# Altium footprint library microbuilder.PCBLIB: 422 footprints (part 22 of 27)
Each footprint in its own frame and in the unit in brackets; x right, y up, seen from the top. Pads: shape width x height; smd on the part's side, far side on the other; paste and mask are expansions set on the pad; w line width, h text height; cw(c..) or ccw(c..) is an arc to the next point about the centre after c.
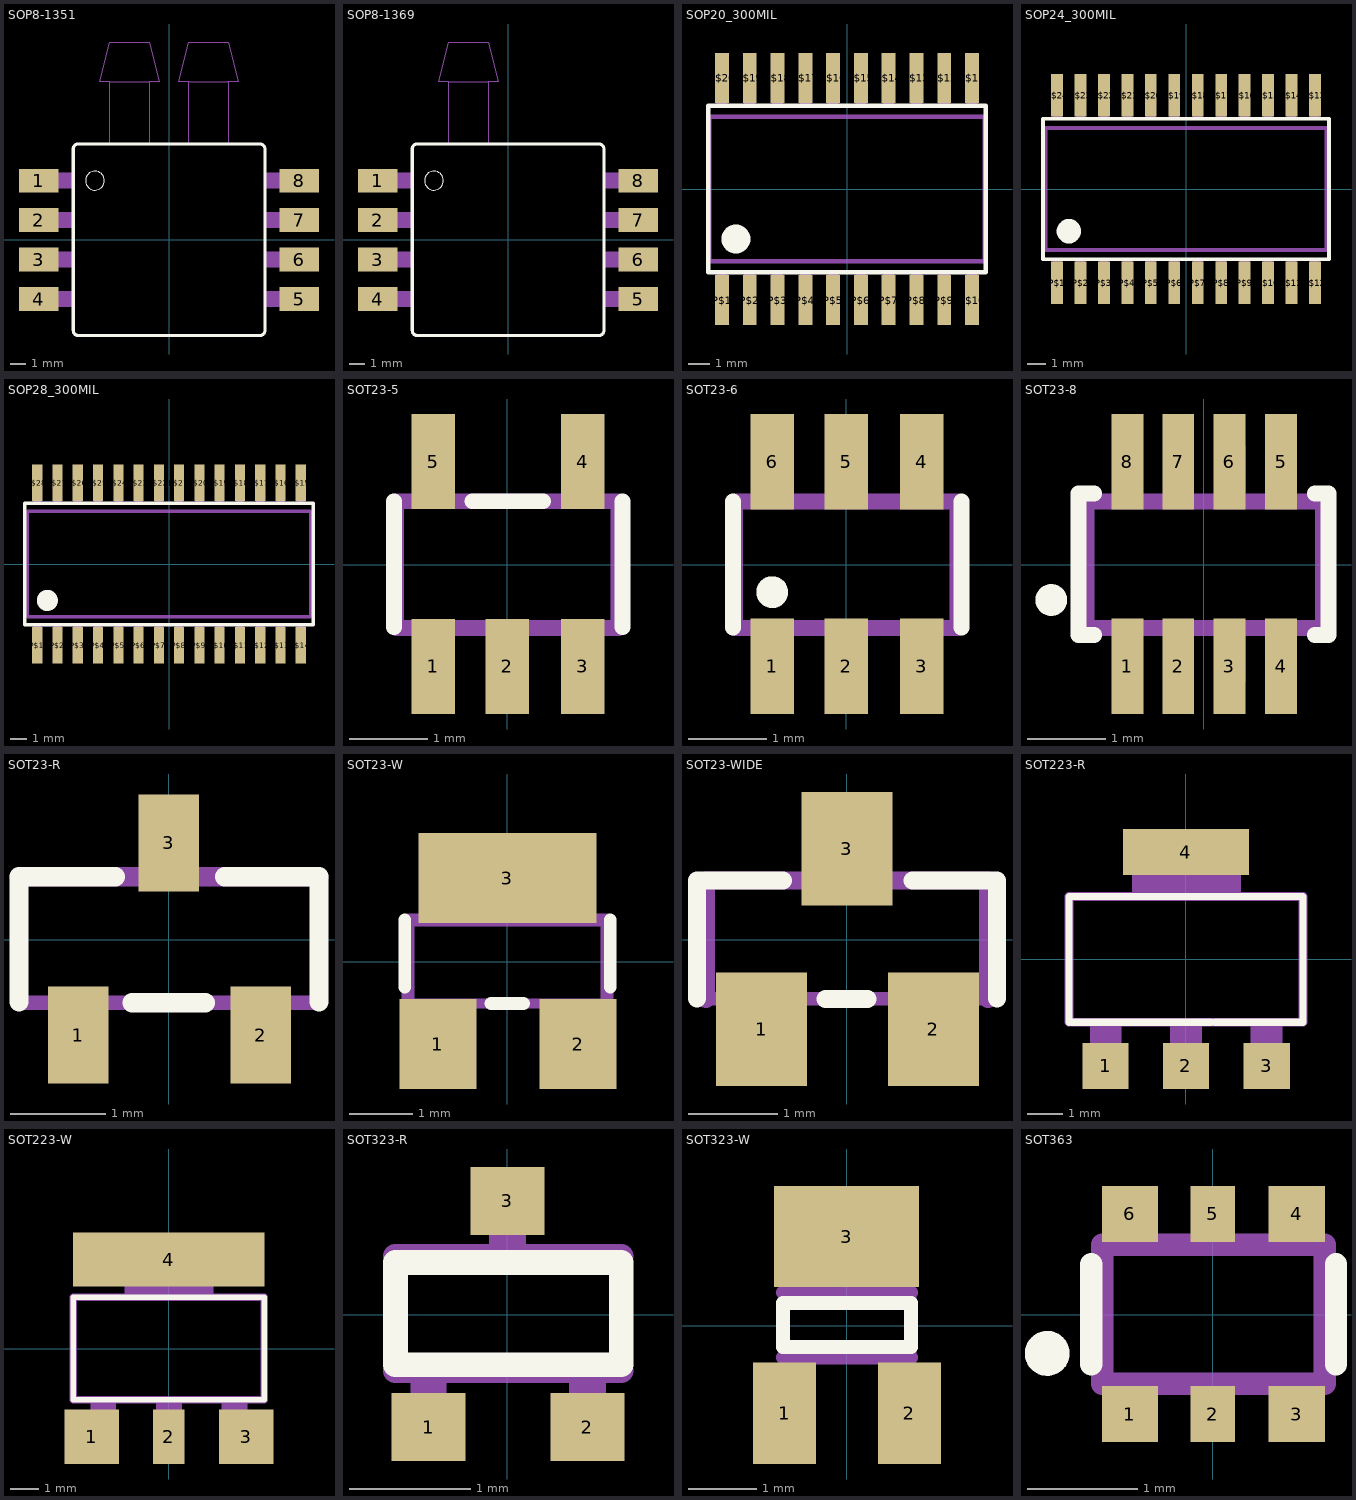
[diagram p21: the footprints below, top view; thin cyan lines are the x and y axes]

## SOP8-1351 [mil]
pads (8):
  rect 100x60 smd: 1(-330,150) 2(-330,50) 3(-330,-50) 4(-330,-150) 5(330,-150) 6(330,-50) 7(330,50) 8(330,150)
Top Overlay:
  circle w0: c-187.5,150 r24
  lines w8: -242.5,-230 ccw(c-230,-230) -230,-242.5 230,-242.5 ccw(c230.25,-229.75) 243,-230 243,230 ccw(c230,230) 230,243 -230,243 ccw(c-229.75,230.25) -242.5,230 -242.5,-230
Mechanical 16:
  rectangle: -350,130 -245,170
  region: 350,170 245,170 245,130 350,130
  rectangle: -350,30 -245,70
  rectangle: -350,-70 -245,-30
  rectangle: -350,-170 -245,-130
  region: 350,70 245,70 245,30 350,30
  region: 350,-30 245,-30 245,-70 350,-70
  region: 350,-130 245,-130 245,-170 350,-170
  lines w2: -150,245 -150,400 ; -50,245 -50,400 ; 50,245 50,400 ; 150,245 150,400 ; -150,400 -175,400 -150,500 -50,500 -25,400 -50,400 ; -150,400 -50,400 ; 50,400 25,400 50,500 150,500 175,400 150,400 ; 50,400 150,400

## SOP8-1369 [mil]
pads (8):
  rect 100x60 smd: 1(-330,150) 2(-330,50) 3(-330,-50) 4(-330,-150) 5(330,-150) 6(330,-50) 7(330,50) 8(330,150)
Top Overlay:
  circle w0: c-187.5,150 r24
  lines w8: -242.5,-230 ccw(c-230,-230) -230,-242.5 230,-242.5 ccw(c230.25,-229.75) 243,-230 243,230 ccw(c230,230) 230,243 -230,243 ccw(c-229.75,230.25) -242.5,230 -242.5,-230
Mechanical 16:
  rectangle: -350,130 -245,170
  region: 350,170 245,170 245,130 350,130
  rectangle: -350,30 -245,70
  rectangle: -350,-70 -245,-30
  rectangle: -350,-170 -245,-130
  region: 350,70 245,70 245,30 350,30
  region: 350,-30 245,-30 245,-70 350,-70
  region: 350,-130 245,-130 245,-170 350,-170
  lines w2: -150,245 -150,400 ; -50,245 -50,400 ; -150,400 -175,400 -150,500 -50,500 -25,400 -50,400 ; -150,400 -50,400

## SOP20_300MIL [mil]
pads (20):
  rect 25x90 smd: P$1(-225,-200) P$2(-175,-200) P$3(-125,-200) P$4(-75,-200) P$5(-25,-200) P$6(25,-200) P$7(75,-200) P$8(125,-200) P$9(175,-200) P$10(225,-200) P$11(225,200) P$12(175,200) P$13(125,200) P$14(75,200) P$15(25,200) P$16(-25,200) P$17(-75,200) P$18(-125,200) P$19(-175,200) P$20(-225,200)
Top Overlay:
  circle w32: c-200,-90 r10
  lines w8: -250,-150 -250,150 250,150 250,-150 -250,-150
Mechanical 16:
  rectangle: -235,-220 -215,-152.5
  rectangle: -185,-220 -165,-152.5
  rectangle: -135,-220 -115,-152.5
  rectangle: -85,-220 -65,-152.5
  rectangle: -35,-220 -15,-152.5
  rectangle: 15,-220 35,-152.5
  rectangle: 65,-220 85,-152.5
  rectangle: 115,-220 135,-152.5
  rectangle: 165,-220 185,-152.5
  rectangle: 215,-220 235,-152.5
  region: 235,220 215,220 215,153 235,153
  region: 185,220 165,220 165,153 185,153
  region: 135,220 115,220 115,153 135,153
  region: 85,220 65,220 65,153 85,153
  region: 35,220 15,220 15,153 35,153
  region: -15,220 -35,220 -35,153 -15,153
  region: -65,220 -85,220 -85,153 -65,153
  region: -115,220 -135,220 -135,153 -115,153
  region: -165,220 -185,220 -185,153 -165,153
  region: -215,220 -235,220 -235,153 -215,153
  lines w5: -250,-150 -250,150 250,150 250,-150 -250,-150
  lines w8: -248,-130 -248,130 248,130 248,-130 -248,-130

## SOP24_300MIL [mil]
pads (24):
  rect 25x90 smd: P$1(-275,-200) P$2(-225,-200) P$3(-175,-200) P$4(-125,-200) P$5(-75,-200) P$6(-25,-200) P$7(25,-200) P$8(75,-200) P$9(125,-200) P$10(175,-200) P$11(225,-200) P$12(275,-200) P$13(275,200) P$14(225,200) P$15(175,200) P$16(125,200) P$17(75,200) P$18(25,200) P$19(-25,200) P$20(-75,200) P$21(-125,200) P$22(-175,200) P$23(-225,200) P$24(-275,200)
Top Overlay:
  circle w32: c-250,-90 r10
  lines w8: -305,-150 -305,150 305,150 305,-150 -305,-150
Mechanical 16:
  rectangle: -285,-220 -265,-152.5
  rectangle: -235,-220 -215,-152.5
  rectangle: -185,-220 -165,-152.5
  rectangle: -135,-220 -115,-152.5
  rectangle: -85,-220 -65,-152.5
  rectangle: -35,-220 -15,-152.5
  rectangle: 15,-220 35,-152.5
  rectangle: 65,-220 85,-152.5
  rectangle: 115,-220 135,-152.5
  rectangle: 165,-220 185,-152.5
  rectangle: 215,-220 235,-152.5
  rectangle: 265,-220 285,-152.5
  region: 285,220 265,220 265,153 285,153
  region: 235,220 215,220 215,153 235,153
  region: 185,220 165,220 165,153 185,153
  region: 135,220 115,220 115,153 135,153
  region: 85,220 65,220 65,153 85,153
  region: 35,220 15,220 15,153 35,153
  region: -15,220 -35,220 -35,153 -15,153
  region: -65,220 -85,220 -85,153 -65,153
  region: -115,220 -135,220 -135,153 -115,153
  region: -165,220 -185,220 -185,153 -165,153
  region: -215,220 -235,220 -235,153 -215,153
  region: -265,220 -285,220 -285,153 -265,153
  lines w5: -305,-150 -305,150 305,150 305,-150 -305,-150
  lines w8: -299,-130 -299,130 299,130 299,-130 -299,-130

## SOP28_300MIL [mil]
pads (28):
  rect 25x90 smd: P$1(-325,-200) P$2(-275,-200) P$3(-225,-200) P$4(-175,-200) P$5(-125,-200) P$6(-75,-200) P$7(-25,-200) P$8(25,-200) P$9(75,-200) P$10(125,-200) P$11(175,-200) P$12(225,-200) P$13(275,-200) P$14(325,-200) P$15(325,200) P$16(275,200) P$17(225,200) P$18(175,200) P$19(125,200) P$20(75,200) P$21(25,200) P$22(-25,200) P$23(-75,200) P$24(-125,200) P$25(-175,200) P$26(-225,200) P$27(-275,200) P$28(-325,200)
Top Overlay:
  circle w32: c-300,-90 r10
  lines w8: -356,-150 -356,150 356,150 356,-150 -356,-150
Mechanical 16:
  rectangle: -335,-220 -315,-152.5
  rectangle: -285,-220 -265,-152.5
  rectangle: -235,-220 -215,-152.5
  rectangle: -185,-220 -165,-152.5
  rectangle: -135,-220 -115,-152.5
  rectangle: -85,-220 -65,-152.5
  rectangle: -35,-220 -15,-152.5
  rectangle: 15,-220 35,-152.5
  rectangle: 65,-220 85,-152.5
  rectangle: 115,-220 135,-152.5
  rectangle: 165,-220 185,-152.5
  rectangle: 215,-220 235,-152.5
  rectangle: 265,-220 285,-152.5
  rectangle: 315,-220 335,-152.5
  region: 335,220 315,220 315,153 335,153
  region: 285,220 265,220 265,153 285,153
  region: 235,220 215,220 215,153 235,153
  region: 185,220 165,220 165,153 185,153
  region: 135,220 115,220 115,153 135,153
  region: 85,220 65,220 65,153 85,153
  region: 35,220 15,220 15,153 35,153
  region: -15,220 -35,220 -35,153 -15,153
  region: -65,220 -85,220 -85,153 -65,153
  region: -115,220 -135,220 -135,153 -115,153
  region: -165,220 -185,220 -185,153 -165,153
  region: -215,220 -235,220 -235,153 -215,153
  region: -265,220 -285,220 -285,153 -265,153
  region: -315,220 -335,220 -335,153 -315,153
  lines w5: -356,-150 -356,150 356,150 356,-150 -356,-150
  lines w8: -349,-130 -349,130 349,130 349,-130 -349,-130

## SOT23-5 [mil]
pads (5):
  rect 22x48 smd: 1(-37.4,-51.19) 2(0,-51.19) 3(38,-51.19) 4(38,52) 5(-37.4,52)
Top Overlay:
  lines w8: -57.09,-31.5 -57.09,32 ; -17.72,32 18,32 ; 58,-31.5 58,32
Mechanical 16:
  rectangle: -47.24,-59.06 -27.56,-33.46
  rectangle: -9.84,-59.06 10,-33.46
  rectangle: 28,-59.06 48,-33.46
  rectangle: 28,34 48,60
  rectangle: -47.24,34 -27.56,60
  lines w8: -56,-31.91 56,-31.91 56,32 -56,32 -56,-31.91

## SOT23-6 [mil]
pads (6):
  rect 22x48 smd: 1(-37.4,-51.18) 2(0,-51.18) 3(38,-51.18) 4(38,52) 5(0,52) 6(-37.4,52)
Top Overlay:
  circle w8: c-37.4,-13.78 r4
  lines w8: -57.09,-31.5 -57.09,32 ; 58,-31.5 58,32
Mechanical 16:
  rectangle: -47.24,-59.06 -27.56,-33.46
  rectangle: -9.84,-59.06 10,-33.46
  rectangle: 28,-59.06 48,-33.46
  rectangle: 28,34 48,60
  rectangle: -9.84,34 10,60
  rectangle: -47.24,34 -27.56,60
  lines w8: -55.98,-31.89 56,-31.89 56,32 -55.98,32 -55.98,-31.89

## SOT23-8 [mil]
pads (8):
  rect 16x48 smd: 1(-38.39,-51.18) 2(-12.8,-51.18) 3(13,-51.18) 4(39,-51.18) 5(39,52) 6(13,52) 7(-12.8,52) 8(-38.39,52)
Top Overlay:
  circle w8: c-76.77,-17.72 r4
  lines w8: -55.12,-35.43 -62.99,-35.43 -62.99,36 -55.12,36 ; 56,-35.43 63,-35.43 63,36 56,36
Mechanical 16:
  rectangle: -45.87,35 -30.91,60
  rectangle: -45.87,-59.06 -30.91,-34.45
  rectangle: -20.28,-59.06 -5.32,-34.45
  rectangle: 6,-59.06 21,-34.45
  rectangle: 31,-59.06 46,-34.45
  rectangle: 31,35 46,60
  rectangle: 6,35 21,60
  rectangle: -20.28,35 -5.32,60
  lines w8: -59.06,-31.89 60,-31.89 60,32 -59.06,32 -59.06,-31.89

## SOT23-R [mil]
pads (3):
  rect 25x40 smd: 1(-37.4,-39.37) 2(38,-39.37) 3(0,40)
Top Overlay:
  lines w8: -61.91,-25.68 -61.91,26 -22.19,26 ; -15.21,-26 15,-26 ; 23,26 62,26 62,-25.68
Mechanical 16:
  rectangle: -9,28 9,51
  rectangle: 28,-51 46,-28
  rectangle: -46,-51 -28,-28
  lines w6: -61.91,26 -61.91,-26 62,-26 62,26
  lines w8: -61.91,26 62,26

## SOT23-W [mil]
pads (3):
  rect 48x56 smd: 1(-43.31,-51.18) 2(44,-51.18)
  rect 111x56 smd: 3(0,52)
Top Overlay:
  lines w8: -63.87,-15.69 -63.87,26 ; -10.21,-26 10,-26 ; 64,-15.69 64,26
Mechanical 16:
  rectangle: -9,28 9,51
  rectangle: 28,-51 46,-28
  rectangle: -46,-51 -28,-28
  lines w6: -61.91,-26 62,-26
  lines w8: -61.91,-26 -61.91,26 62,26 62,-26

## SOT23-WIDE [mil]
pads (3):
  rect 40x50 smd: 1(-37.4,-39.37) 2(38,-39.37) 3(0,40)
Top Overlay:
  lines w8: -65.84,-25.68 -65.84,26 -28.09,26 ; -9.31,-26 9,-26 ; 29,26 66,26 66,-25.68
Mechanical 16:
  rectangle: -9,28 9,51
  rectangle: 28,-51 46,-28
  rectangle: -46,-51 -28,-28
  lines w6: -61.91,-26 62,-26
  lines w8: -61.91,-26 -61.91,26 62,26 62,-26

## SOT223-R [mil]
pads (4):
  rect 52x52 smd: 1(-90.55,-120.08) 2(0,-120.08) 3(91,-120.08)
  rect 142x52 smd: 4(0,121)
Top Overlay:
  lines w8: -131.89,-70.87 -131.89,71 132,71 132,-70.87 ; -129.06,-70.87 29,-70.87 ; 32,-70.87 130,-70.87
Mechanical 16:
  rectangle: -108.27,-135.83 -72.83,-74.8
  rectangle: -17.72,-135.83 18,-74.8
  rectangle: 73,-135.83 109,-74.8
  rectangle: -61.02,75 62,136
  lines w10: -131.89,-70.87 -131.89,71 132,71 132,-70.87 -131.89,-70.87

## SOT223-W [mil]
pads (4):
  rect 75x75 smd: 1(-106.3,-122.05) 3(107,-122.05)
  rect 44x75 smd: 2(0,-122.05)
  rect 264x75 smd: 4(0,123)
Top Overlay:
  lines w8: -131.89,-70.87 -131.89,71 73,71 78,71 132,71 132,-70.87 ; -129.06,-70.87 29,-70.87 ; 32,-70.87 130,-70.87
Mechanical 16:
  rectangle: -108.27,-135.83 -72.83,-74.8
  rectangle: -17.72,-135.83 18,-74.8
  rectangle: 73,-135.83 109,-74.8
  rectangle: -61.02,75 62,136
  lines w10: -131.89,-70.87 -131.89,71 132,71 132,-70.87 -131.89,-70.87

## SOT323-R [mil]
pads (3):
  rect 24x22 smd: 1(-25.59,-36.42) 2(26,-36.42) 3(0,37)
Top Overlay:
  lines w8: -36.31,-16.16 37,-16.16 37,17 -36.31,17 -36.31,-16.16
Mechanical 16:
  rectangle: -31.5,-43.31 -19.68,-19.68
  rectangle: 20,-43.31 32,-19.68
  rectangle: -5.91,20 6,44
  lines w6: -36.31,-18.13 -36.31,19 ; 37,-18.13 37,19
  lines w8: -36.31,-18.13 37,-18.13 ; -36.31,19 37,19

## SOT323-W [mil]
pads (3):
  rect 36x58 smd: 1(-35.43,-50.2) 2(36,-50.2)
  rect 83x58 smd: 3(0,51)
Top Overlay:
  lines w8: -36.31,-12.22 37,-12.22 37,13 -36.31,13 -36.31,-12.22
Mechanical 16:
  rectangle: -31.5,-43.31 -19.68,-19.68
  rectangle: 20,-43.31 32,-19.68
  rectangle: -5.91,20 6,44
  lines w6: -36.31,-18.13 -36.31,19 ; 37,-18.13 37,19
  lines w8: -36.31,-18.13 37,-18.13 ; -36.31,19 37,19

## SOT363 [mil]
pads (6):
  rect 20x20 smd: 1(-29.53,-35.43) 3(30,-35.43) 4(30,36) 6(-29.53,36)
  rect 16x20 smd: 2(0,-35.43) 5(0,36)
Top Overlay:
  circle w8: c-59.06,-13.78 r4
  lines w8: -43.31,-17.72 -43.31,18 ; 44,-17.72 44,18
Mechanical 16:
  rectangle: -4.92,-41.34 5,-27.56
  rectangle: -30.51,-41.34 -20.67,-27.56
  rectangle: 21,-41.34 31,-27.56
  rectangle: -30.51,28 -20.67,42
  rectangle: -4.92,28 5,42
  rectangle: 21,28 31,42
  lines w8: -39.37,-24.61 40,-24.61 40,25 -39.37,25 -39.37,-24.61